# Altium footprint library MMT_Connectors_Buttons_Switches.PcbLib: 46 footprints (part 2 of 3)
Each footprint in its own frame and in the unit in brackets; x right, y up, seen from the top. Pads: shape width x height; smd on the part's side, far side on the other; paste and mask are expansions set on the pad; w line width, h text height; cw(c..) or ccw(c..) is an arc to the next point about the centre after c.
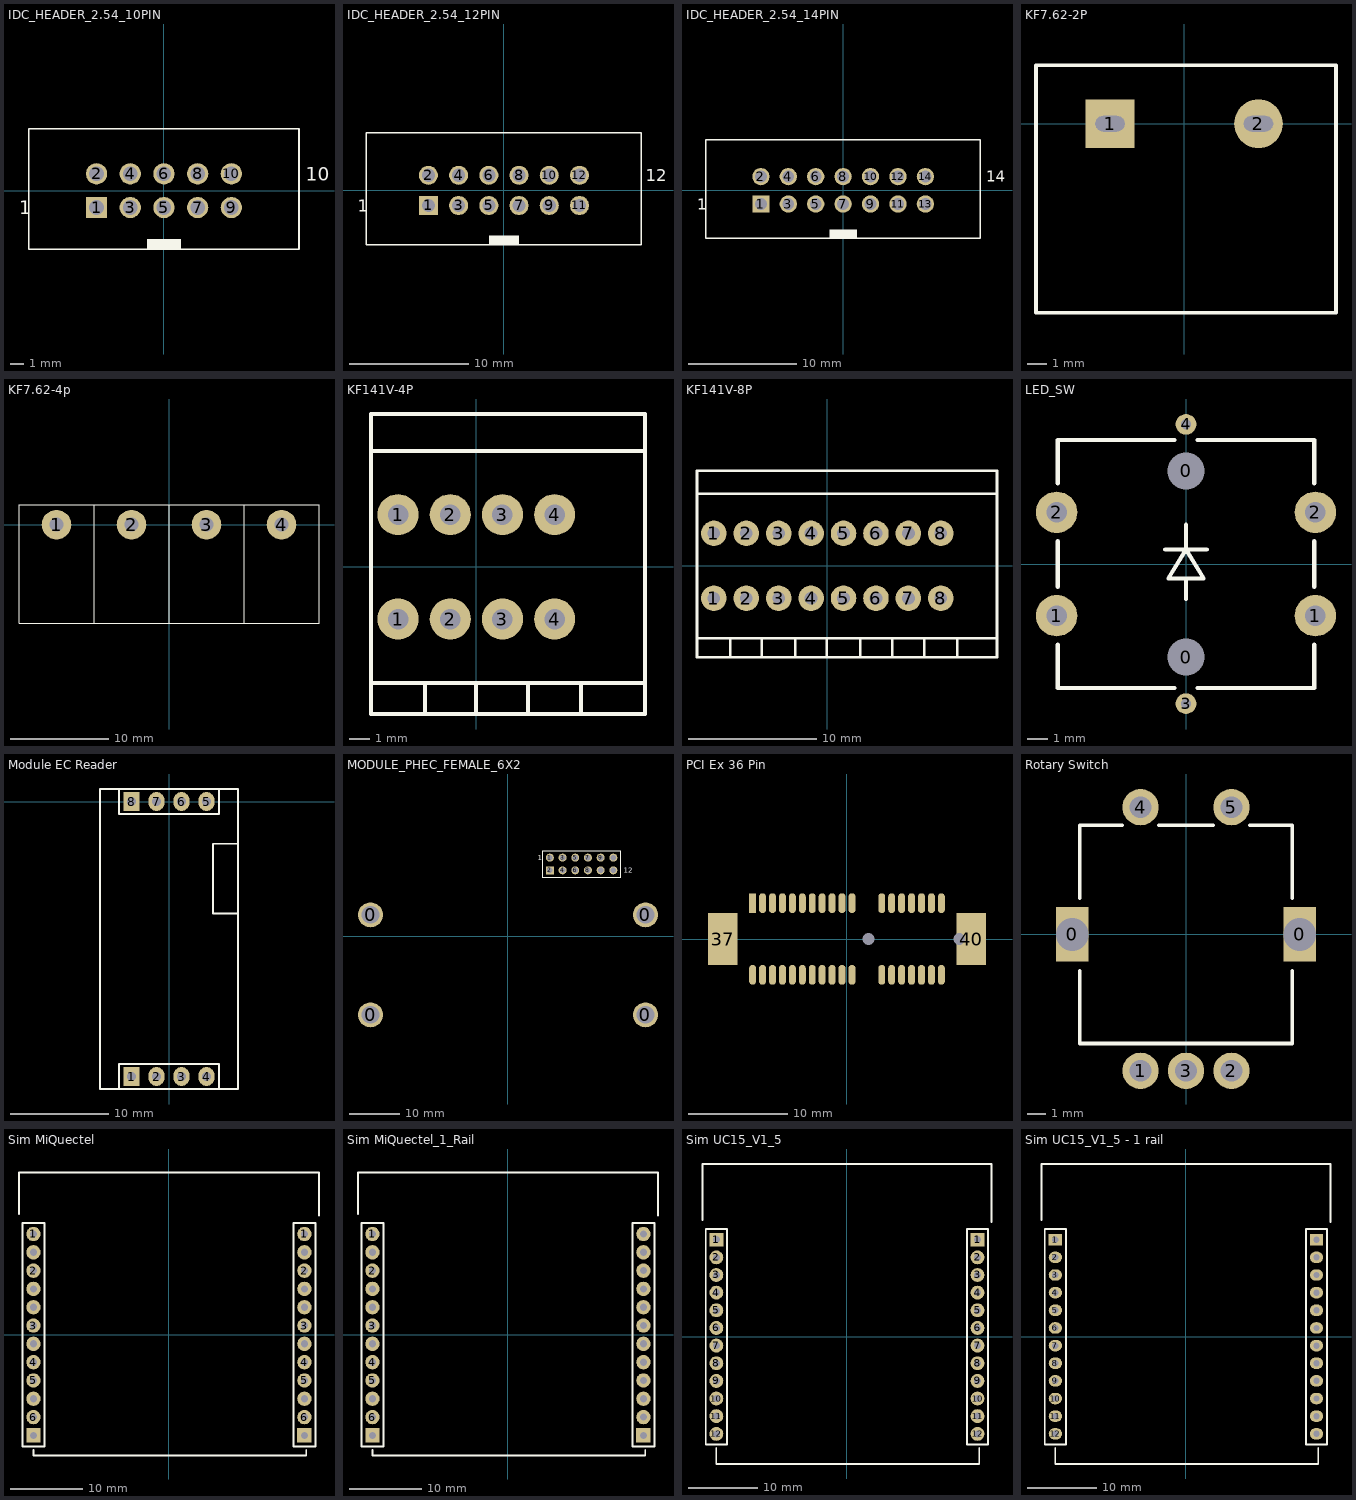
[diagram p1: the footprints below, top view; thin cyan lines are the x and y axes]

## IDC_HEADER_2.54_10PIN [mm] "10 pins, straight, gold plating"
height 9.1
pads (10):
  rect 1.6x1.6 hole 1.1: 1(-5.08,-1.27)
  round 1.6 hole 1.1: 2(-5.08,1.27) 3(-2.54,-1.27) 4(-2.54,1.27) 5(0,-1.27) 6(0,1.27) 7(2.54,-1.27) 8(2.54,1.27) 9(5.08,-1.27) 10(5.08,1.27)
Top Overlay:
  rectangle: -1.27,-4.425 1.27,-3.64
  lines w0.127: -10.18,-4.425 -10.18,4.675 10.18,4.675 10.18,-4.425 -10.18,-4.425
  text "10" at 10.668,0.762 h1.02
  text "1" at -10.922,-1.778 h1.02
3D body "61201021621.stp": height 9.13, standoff -2.98, extent -10.18,-4.425 10.18,4.75

## IDC_HEADER_2.54_12PIN [mm] "12 pins, straight, gold plating"
height 9.1
pads (12):
  rect 1.6x1.6 hole 1.1: 1(-6.35,-1.27)
  round 1.6 hole 1.1: 2(-6.35,1.27) 3(-3.81,-1.27) 4(-3.81,1.27) 5(-1.27,-1.27) 6(-1.27,1.27) 7(1.27,-1.27) 8(1.27,1.27) 9(3.81,-1.27) 10(3.81,1.27) 11(6.35,-1.27) 12(6.35,1.27)
Top Overlay:
  rectangle: -1.27,-4.595 1.27,-3.81
  lines w0.127: -11.557,-4.572 -11.557,4.826 11.557,4.826 11.557,-4.572 -11.557,-4.572
  text "1" at -12.27,-1.8 h1.02
  text "12" at 11.938,0.762 h1.02
3D body "User Library-BH_12_V.STEP": height 8.9, standoff -3.2, extent -11.43,-4.45 11.43,4.65

## IDC_HEADER_2.54_14PIN [mm] "14 pins, straight, gold plating"
height 9.1
pads (14):
  rect 1.6x1.6 hole 1.1: 1(-7.62,-1.27)
  round 1.6 hole 1.1: 2(-7.62,1.27) 3(-5.08,-1.27) 4(-5.08,1.27) 5(-2.54,-1.27) 6(-2.54,1.27) 7(0,-1.27) 8(0,1.27) 9(2.54,-1.27) 10(2.54,1.27) 11(5.08,-1.27) 12(5.08,1.27) 13(7.62,-1.27) 14(7.62,1.27)
Top Overlay:
  rectangle: -1.27,-4.425 1.27,-3.64
  lines w0.127: -12.72,-4.425 -12.72,4.675 12.72,4.675 12.72,-4.425 -12.72,-4.425
  text "1" at -13.54,-1.8 h1.02
  text "14" at 13.24,0.8 h1.02
3D body "User Library-DC14P.step": height 9.13, standoff -2.98, extent -12.72,-4.425 12.72,4.675

## KF7.62-2P [mm]
height 15.3
pads (2):
  rect 2.5x2.5 hole 0.8 slot 1.5 at 0 deg: 1(-3.81,0)
  round 2.5 hole 0.8 slot 1.5 at 0 deg: 2(3.81,0)
Top Overlay:
  lines w0.2: -7.61,-9.7 7.79,-9.7 7.79,3 -7.61,3 -7.61,-9.7
3D body "User Library-7_62-2P.step": height 12.5, standoff -6.25, extent -7.55,-9.6 7.69,2.9

## KF7.62-4p [mm]
pads (4):
  round 3 hole 1.4: 1(-11.43,0) 2(-3.81,0) 3(3.81,0) 4(11.43,0)
Top Overlay:
  lines w0.025: -15.24,-10 15.24,-10 15.24,2 -15.24,2 -15.24,-10
  lines w0.1: -7.62,-10 -7.62,2 ; 0,-10 0,2 ; 7.62,-10 7.62,2 ; -15.24,-10 15.24,-10 15.24,2 -15.24,2 -15.24,-10
3D body "User Library-KF7_62 - 4P-1.STEP": height 12.56, standoff -6.14, extent -15.215,-10.338 15.265,1.662

## KF141V-4P [mm] "4P-KF141V Terminal Block Straight 4 position 2.54"
height 12.6
pads (8):
  round 2 hole 1: 1(-3.81,-2.54) 1(-3.81,2.54) 2(-1.27,-2.54) 2(-1.27,2.54) 3(1.27,-2.54) 3(1.27,2.54) 4(3.81,-2.54) 4(3.81,2.54)
Top Overlay:
  lines w0.2: -5.13,-5.66 8.21,-5.66 ; -2.49,-7.16 -2.49,-5.66 ; -0.01,-7.16 -0.01,-5.66 ; 2.51,-7.16 2.51,-5.66 ; 5.09,-7.16 5.09,-5.66 ; -5.13,5.64 -5.13,7.44 8.21,7.44 8.21,5.64 ; -5.13,5.64 8.21,5.64 ; -5.13,5.64 -5.13,-7.16 8.21,-7.16 8.21,-5.66 ; 8.21,-5.66 8.21,5.64
3D body "691403900004B.stp": height 13.65, standoff -3.45, extent -4.81,-5.54 7.89,7.26

## KF141V-8P [mm] "8P-KF141V Terminal Block Straight 8 position 2.54"
height 12.6
pads (16):
  round 2 hole 1: 1(-8.89,-2.54) 1(-8.89,2.54) 2(-6.35,-2.54) 2(-6.35,2.54) 3(-3.81,-2.54) 3(-3.81,2.54) 4(-1.27,-2.54) 4(-1.27,2.54) 5(1.27,-2.54) 5(1.27,2.54) 6(3.81,-2.54) 6(3.81,2.54) 7(6.35,-2.54) 7(6.35,2.54) 8(8.89,-2.54) 8(8.89,2.54)
Top Overlay:
  lines w0.2: -7.61,-7.16 -7.61,-5.66 ; -5.13,-7.16 -5.13,-5.66 ; -2.51,-7.16 -2.51,-5.66 ; -0.03,-7.16 -0.03,-5.66 ; 2.59,-7.16 2.59,-5.66 ; 5.07,-7.16 5.07,-5.66 ; 7.59,-7.16 7.59,-5.66 ; 10.17,-7.16 10.17,-5.66 ; -10.21,-5.66 13.29,-5.66 ; -10.21,-5.66 -10.21,-7.16 13.29,-7.16 13.29,-5.66 ; -10.21,-5.66 -10.21,5.64 ; -10.21,5.64 -10.21,7.44 -3.21,7.44 13.29,7.44 13.29,5.64 ; -10.21,5.64 13.29,5.64 ; 13.29,-5.66 13.29,5.64
3D body "DG141V-2.54-8?.STEP": height 13.6, standoff -3.3, extent -9.79,-5.4 13.07,7.2

## LED_SW [mm]
height 6.5
pads (8):
  round 1.5 hole 1.8: 0(0,-4.5) 0(0,4.5)
  round 2 hole 1: 1(-6.25,-2.5) 1(6.25,-2.5) 2(-6.25,2.5) 2(6.25,2.5)
  round 1 hole 0.5: 3(0,-6.75) 4(0,6.75)
Top Overlay:
  lines w0.2: -6.2,-3.9 -6.2,-6 -0.55,-6 ; -6.2,-1.1 -6.2,1.1 ; -6.2,3.9 -6.2,6 -0.55,6 ; -1,0.7 1,0.7 ; 0,-1.7 0,-0.7 ; 0,1.9 0,0.7 ; 0.55,-6 6.2,-6 6.2,-3.9 ; 0.55,6 6.2,6 6.2,3.9 ; 6.2,-1.1 6.2,1.1 ; 0,0.7 0.85,-0.7 -0.85,-0.7 0,0.7

## Module EC Reader [mil]
height 200
pads (8):
  rect 65x75 hole 36: 1(-150,-1100) 8(-150,0)
  oval 65x75 hole 36: 2(-50,-1100) 3(50,-1100) 4(150,-1100) 5(150,0) 6(50,0) 7(-50,0)
Top Overlay:
  lines w7: 275.59,-447.76 175.59,-447.76 175.59,-169.02 275.59,-169.02 ; -200,-1150 200,-1150 200,-1050 -200,-1050 -200,-1150 ; -200,-50 -200,50 200,50 200,-50 -200,-50
  lines w7.01: -200,-1150 -275.59,-1150 -275.59,50 -200,50 ; 200,-1150 275.59,-1150 275.59,50 200,50
3D body "User Library-RM254_4pin.step": height 237.01, standoff -122.05, extent -198.03,-1150 201.97,-1050
3D body "User Library-RM254_4pin.step": height 237.01, standoff -122.05, extent -200.79,-50 199.21,50

## MODULE_PHEC_FEMALE_6X2 [mm] "12 pins, straight, gold plating"
height 9.1
pads (16):
  round 5 hole 3.5: 0(-27.5,-15.72) 0(-27.5,4.28) 0(27.5,-15.72) 0(27.5,4.28)
  round 1.6 hole 1.1: 1(8.37,15.72) 3(10.91,15.72) 4(10.91,13.18) 5(13.45,15.72) 6(13.45,13.18) 7(15.99,15.72) 8(15.99,13.18) 9(18.53,15.72) 10(18.53,13.18) 11(21.07,15.72) 12(21.07,13.18)
  rect 1.6x1.6 hole 1.1: 2(8.37,13.18)
Top Overlay:
  lines w0.127: 6.846,11.783 22.594,11.783 22.594,17.117 6.846,17.117 6.846,11.783
  text "12" at 23.1,12.68 h1.02
  text "1" at 6,15.18 h1.02
3D body "pH_EC_Extend_v2.2.step": height 21.51, standoff -0.01, extent -32.5,-30.7 32.5,19.3

## PCI Ex 36 Pin [mm]
pads (40):
  rect 0.7x2 smd: 1(-9.5,3.6)
  oval 0.7x2 smd: 2(-9.5,-3.6) 3(-8.5,3.6) 4(-8.5,-3.6) 5(-7.5,3.6) 6(-7.5,-3.6) 7(-6.5,3.6) 8(-6.5,-3.6) 9(-5.5,3.6) 10(-5.5,-3.6) 11(-4.5,3.6) 12(-4.5,-3.6) 13(-3.5,3.6) 14(-3.5,-3.6) 15(-2.5,3.6) 16(-2.5,-3.6) 17(-1.5,3.6) 18(-1.5,-3.6) 19(-0.5,3.6) 20(-0.5,-3.6) 21(0.5,3.6) 22(0.5,-3.6) 23(3.5,3.6) 24(3.5,-3.6) 25(4.5,3.6) 26(4.5,-3.6) 27(5.5,3.6) 28(5.5,-3.6) 29(6.5,3.6) 30(6.5,-3.6) 31(7.5,3.6) 32(7.5,-3.6) 33(8.5,3.6) 34(8.5,-3.6) 35(9.5,3.6) 36(9.5,-3.6)
  rect 3x5.2 smd: 37(-12.5,0) 40(12.5,0)
  round 0 hole 1.2: 38(2.15,0) 39(11.3,0)
3D body "10061913-xx0.stp": height 11.07, standoff -0.92, extent -13.1,-5.1 13.1,4.1

## Rotary Switch [mm]
height 24.5
pads (7):
  rect 1.8x3 hole 1.8 square unplated: 0(-6.25,0) 0(6.25,0)
  round 2 hole 1.2: 1(-2.5,-7.5) 2(2.5,-7.5) 3(0,-7.5) 4(-2.5,7) 5(2.5,7)
Top Overlay:
  lines w0.2: -5.85,-2 -5.85,-6 5.85,-6 5.85,-2 ; -5.85,2 -5.85,6 -3.5,6 ; -1.5,6 1.5,6 ; 3.5,6 5.85,6 5.85,2

## Sim MiQuectel [mm] "Modelu sim MiQuectel"
pads (24):
  round 2 hole 1: 1(-18.796,13.97) 1(18.796,13.97) 2(-18.796,8.89) 2(18.796,8.89) 3(-18.796,1.27) 3(18.796,1.27) 4(-18.796,-3.81) 4(18.796,-3.81) 5(-18.796,-6.35) 5(18.796,-6.35) 6(-18.796,-11.43) 6(18.796,-11.43) ""(-18.796,-8.89) ""(-18.796,3.81) ""(-18.796,6.35) ""(-18.796,-1.27) ""(-18.796,11.43) ""(18.796,-8.89) ""(18.796,3.81) ""(18.796,6.35) ""(18.796,-1.27) ""(18.796,11.43)
  rect 2x2 hole 1: ""(-18.796,-13.97) ""(18.796,-13.97)
Top Overlay:
  lines w0.254: -20.803,16.764 -20.803,22.504 20.817,22.504 20.796,16.508 ; -18.796,-16.002 -18.796,-16.764 19.05,-16.764 19.05,-16.002 ; -20.32,-15.494 -17.272,-15.494 -17.272,15.494 -20.32,15.494 -20.32,-15.494 ; 17.272,-15.494 17.272,15.494 20.32,15.494 20.32,-15.494 17.272,-15.494
3D body "M95_V1.step": height 13.01, standoff 2.59, extent -20.79,-16.104 20.739,22.147
3D body "Samtec-TSW-107-07-G-S.step": height 8.38, standoff -2.54, extent -20.066,-15.24 -17.526,2.54
3D body "Samtec-TSW-107-07-G-S.step": height 8.38, standoff -2.54, extent -20.066,-12.7 -17.526,5.08
3D body "Samtec-TSW-107-07-G-S.step": height 8.38, standoff -2.54, extent -20.066,-2.54 -17.526,15.24
3D body "Samtec-TSW-107-07-G-S.step": height 8.38, standoff -2.54, extent 17.526,-2.54 20.066,15.24
3D body "Samtec-TSW-107-07-G-S.step": height 8.38, standoff -2.54, extent 17.526,-12.7 20.066,5.08
3D body "Samtec-TSW-107-07-G-S.step": height 8.38, standoff -2.54, extent 17.526,-15.24 20.066,2.54

## Sim MiQuectel_1_Rail [mm] "Modelu sim MiQuectel"
pads (24):
  round 2 hole 1: 1(-18.796,13.97) 2(-18.796,8.89) 3(-18.796,1.27) 4(-18.796,-3.81) 5(-18.796,-6.35) 6(-18.796,-11.43) ""(-18.796,-8.89) ""(-18.796,3.81) ""(-18.796,6.35) ""(-18.796,-1.27) ""(-18.796,11.43) ""(18.796,-3.81) ""(18.796,-8.89) ""(18.796,-6.35) ""(18.796,3.81) ""(18.796,6.35) ""(18.796,13.97) ""(18.796,-11.43) ""(18.796,-1.27) ""(18.796,1.27) ""(18.796,8.89) ""(18.796,11.43)
  rect 2x2 hole 1: ""(-18.796,-13.97) ""(18.796,-13.97)
Top Overlay:
  lines w0.254: -20.803,16.764 -20.803,22.504 20.817,22.504 20.796,16.508 ; -18.796,-16.002 -18.796,-16.764 19.05,-16.764 19.05,-16.002 ; -20.32,-15.494 -17.272,-15.494 -17.272,15.494 -20.32,15.494 -20.32,-15.494 ; 17.272,-15.494 17.272,15.494 20.32,15.494 20.32,-15.494 17.272,-15.494
3D body "M95_V1.step": height 13.01, standoff 2.59, extent -20.79,-16.104 20.739,22.147
3D body "Samtec-TSW-107-07-G-S.step": height 8.38, standoff -2.54, extent -20.066,-15.24 -17.526,2.54
3D body "Samtec-TSW-107-07-G-S.step": height 8.38, standoff -2.54, extent -20.066,-12.7 -17.526,5.08
3D body "Samtec-TSW-107-07-G-S.step": height 8.38, standoff -2.54, extent -20.066,-2.54 -17.526,15.24
3D body "Samtec-TSW-107-07-G-S.step": height 8.38, standoff -2.54, extent 17.526,-2.54 20.066,15.24
3D body "Samtec-TSW-107-07-G-S.step": height 8.38, standoff -2.54, extent 17.526,-12.7 20.066,5.08
3D body "Samtec-TSW-107-07-G-S.step": height 8.38, standoff -2.54, extent 17.526,-15.24 20.066,2.54

## Sim UC15_V1_5 [mm] "Module Sim MiQuectel"
pads (24):
  rect 2x2 hole 1: 1(-18.796,13.97) 1(18.796,13.97)
  round 2 hole 1: 2(-18.796,11.43) 2(18.796,11.43) 3(-18.796,8.89) 3(18.796,8.89) 4(-18.796,6.35) 4(18.796,6.35) 5(-18.796,3.81) 5(18.796,3.81) 6(-18.796,1.27) 6(18.796,1.27) 7(-18.796,-1.27) 7(18.796,-1.27) 8(-18.796,-3.81) 8(18.796,-3.81) 9(-18.796,-6.35) 9(18.796,-6.35) 10(-18.796,-8.89) 10(18.796,-8.89) 11(-18.796,-11.43) 11(18.796,-11.43) 12(-18.796,-13.97) 12(18.796,-13.97)
Top Overlay:
  lines w0.254: -20.803,16.764 -20.803,24.867 20.825,24.867 20.796,16.508 ; -18.796,-16.002 -18.796,-18.313 19.05,-18.313 19.05,-16.002 ; -20.32,-15.494 -20.32,15.494 -17.272,15.494 -17.272,-15.494 -20.32,-15.494 ; 17.272,-15.494 20.32,-15.494 20.32,15.494 17.272,15.494 17.272,-15.494
3D body "Samtec-TSW-107-07-G-S.step": height 8.38, standoff -2.54, extent 17.526,-15.24 20.066,2.54
3D body "Samtec-TSW-107-07-G-S.step": height 8.38, standoff -2.54, extent 17.526,-12.7 20.066,5.08
3D body "Samtec-TSW-107-07-G-S.step": height 8.38, standoff -2.54, extent 17.526,-2.54 20.066,15.24
3D body "Samtec-TSW-107-07-G-S.step": height 8.38, standoff -2.54, extent -20.066,-2.54 -17.526,15.24
3D body "Samtec-TSW-107-07-G-S.step": height 8.38, standoff -2.54, extent -20.066,-12.7 -17.526,5.08
3D body "Samtec-TSW-107-07-G-S.step": height 8.38, standoff -2.54, extent -20.066,-15.24 -17.526,2.54
3D body "UC15_V1_5.step": height 11.25, standoff 2.59, extent -20.27,-18.391 20.168,24.613

## Sim UC15_V1_5 - 1 rail [mil] "Module Sim MiQuectel"
pads (24):
  rect 75x65 hole 36: 1(-740,550) ""(740,550)
  oval 75x65 hole 36: 2(-740,450) 3(-740,350) 4(-740,250) 5(-740,150) 6(-740,50) 7(-740,-50) 8(-740,-150) 9(-740,-250) 10(-740,-350) 11(-740,-450) 12(-740,-550) ""(740,-550) ""(740,-150) ""(740,-350) ""(740,-250) ""(740,150) ""(740,250) ""(740,-450) ""(740,-50) ""(740,50) ""(740,350) ""(740,450)
Top Overlay:
  lines w10: -819,660 -819,979 819.87,979 818.74,649.9 ; -740,-630 -740,-721 750,-721 750,-630 ; -800,-610 -800,610 -680,610 -680,-610 -800,-610 ; 680,-610 800,-610 800,610 680,610 680,-610
3D body "Samtec-TSW-107-07-G-S.step": height 330, standoff -100, extent 690,-600 790,100
3D body "Samtec-TSW-107-07-G-S.step": height 330, standoff -100, extent 690,-500 790,200
3D body "Samtec-TSW-107-07-G-S.step": height 330, standoff -100, extent 690,-100 790,600
3D body "Samtec-TSW-107-07-G-S.step": height 330, standoff -100, extent -790,-100 -690,600
3D body "Samtec-TSW-107-07-G-S.step": height 330, standoff -100, extent -790,-500 -690,200
3D body "Samtec-TSW-107-07-G-S.step": height 330, standoff -100, extent -790,-600 -690,100
3D body "UC15_V1_5.step": height 442.91, standoff 101.91, extent -798.05,-724.07 794,969